# Altium footprint library ref-packages.PCBLIB: 1544 footprints (part 76 of 103)
Each footprint in its own frame and in the unit in brackets; x right, y up, seen from the top. Pads: shape width x height; smd on the part's side, far side on the other; paste and mask are expansions set on the pad; w line width, h text height; cw(c..) or ccw(c..) is an arc to the next point about the centre after c.
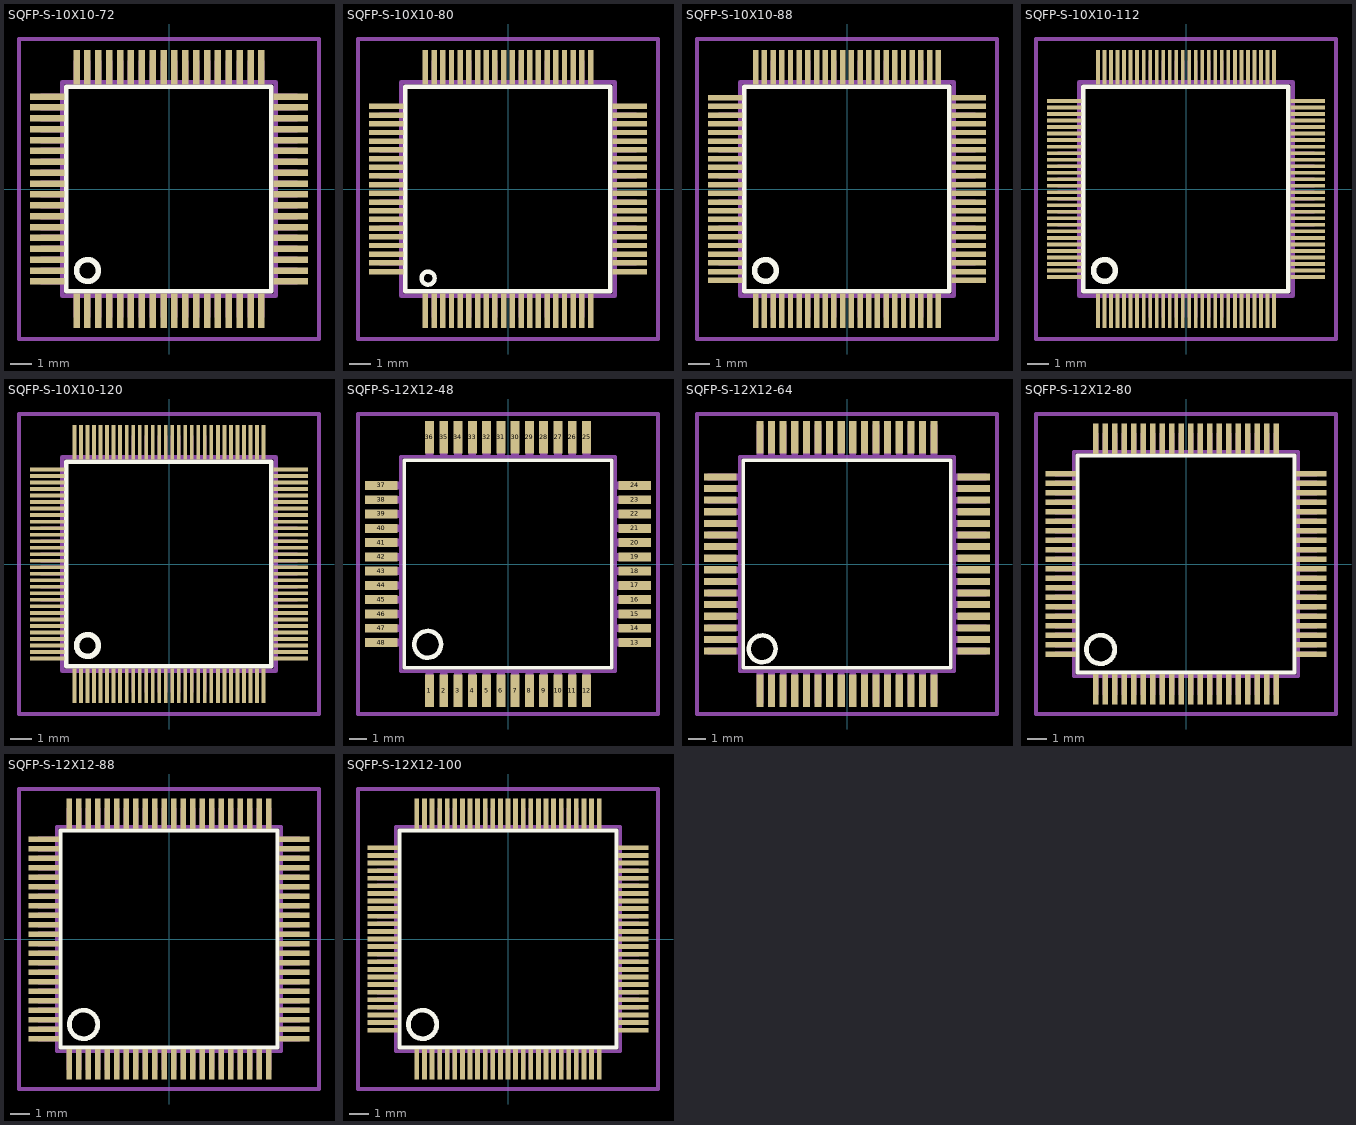
[diagram p75: the footprints below, top view; thin cyan lines are the x and y axes]

## SQFP-S-10X10-72 [mil]
pads (72):
  rect 11.81x62.99 smd: 1(-167.32,-220.47) 2(-147.64,-220.47) 3(-127.95,-220.47) 4(-108.27,-220.47) 5(-88.58,-220.47) 6(-68.9,-220.47) 7(-49.21,-220.47) 8(-29.53,-220.47) 9(-9.84,-220.47) 10(9.84,-220.47) 11(29.53,-220.47) 12(49.21,-220.47) 13(68.9,-220.47) 14(88.58,-220.47) 15(108.27,-220.47) 16(127.95,-220.47) 17(147.64,-220.47) 18(167.32,-220.47) 37(167.32,220.47) 38(147.64,220.47) 39(127.95,220.47) 40(108.27,220.47) 41(88.58,220.47) 42(68.9,220.47) 43(49.21,220.47) 44(29.53,220.47) 45(9.84,220.47) 46(-9.84,220.47) 47(-29.53,220.47) 48(-49.21,220.47) 49(-68.9,220.47) 50(-88.58,220.47) 51(-108.27,220.47) 52(-127.95,220.47) 53(-147.64,220.47) 54(-167.32,220.47)
  rect 62.99x11.81 smd: 19(220.47,-167.32) 20(220.47,-147.64) 21(220.47,-127.95) 22(220.47,-108.27) 23(220.47,-88.58) 24(220.47,-68.9) 25(220.47,-49.21) 26(220.47,-29.53) 27(220.47,-9.84) 28(220.47,9.84) 29(220.47,29.53) 30(220.47,49.21) 31(220.47,68.9) 32(220.47,88.58) 33(220.47,108.27) 34(220.47,127.95) 35(220.47,147.64) 36(220.47,167.32) 55(-220.47,167.32) 56(-220.47,147.64) 57(-220.47,127.95) 58(-220.47,108.27) 59(-220.47,88.58) 60(-220.47,68.9) 61(-220.47,49.21) 62(-220.47,29.53) 63(-220.47,9.84) 64(-220.47,-9.84) 65(-220.47,-29.53) 66(-220.47,-49.21) 67(-220.47,-68.9) 68(-220.47,-88.58) 69(-220.47,-108.27) 70(-220.47,-127.95) 71(-220.47,-147.64) 72(-220.47,-167.32)
Top Overlay:
  circle w10: c-147.64,-147.64 r19.69
  lines w8: -185.83,-185.43 185.43,-185.43 185.43,185.43 -185.83,185.43 -185.83,-185.43
Mechanical 16:
  rectangle: -173.23,-232.28 -161.42,-194.88
  rectangle: -153.54,-232.28 -141.73,-194.88
  rectangle: -133.86,-232.28 -122.05,-194.88
  rectangle: -114.17,-232.28 -102.36,-194.88
  rectangle: -94.49,-232.28 -82.68,-194.88
  rectangle: -74.8,-232.28 -62.99,-194.88
  rectangle: -55.12,-232.28 -43.31,-194.88
  rectangle: -35.43,-232.28 -23.62,-194.88
  rectangle: -15.75,-232.28 -3.94,-194.88
  rectangle: 3.94,-232.28 15.75,-194.88
  rectangle: 23.62,-232.28 35.43,-194.88
  rectangle: 43.31,-232.28 55.12,-194.88
  rectangle: 62.99,-232.28 74.8,-194.88
  rectangle: 82.68,-232.28 94.49,-194.88
  rectangle: 102.36,-232.28 114.17,-194.88
  rectangle: 122.05,-232.28 133.86,-194.88
  rectangle: 141.73,-232.28 153.54,-194.88
  rectangle: 161.42,-232.28 173.23,-194.88
  rectangle: 194.88,-173.23 232.28,-161.42
  rectangle: 194.88,-153.54 232.28,-141.73
  rectangle: 194.88,-133.86 232.28,-122.05
  rectangle: 194.88,-114.17 232.28,-102.36
  rectangle: 194.88,-94.49 232.28,-82.68
  rectangle: 194.88,-74.8 232.28,-62.99
  rectangle: 194.88,-55.12 232.28,-43.31
  rectangle: 194.88,-35.43 232.28,-23.62
  rectangle: 194.88,-15.75 232.28,-3.94
  rectangle: 194.88,3.94 232.28,15.75
  rectangle: 194.88,23.62 232.28,35.43
  rectangle: 194.88,43.31 232.28,55.12
  rectangle: 194.88,62.99 232.28,74.8
  rectangle: 194.88,82.68 232.28,94.49
  rectangle: 194.88,102.36 232.28,114.17
  rectangle: 194.88,122.05 232.28,133.86
  rectangle: 194.88,141.73 232.28,153.54
  rectangle: 194.88,161.42 232.28,173.23
  rectangle: 161.42,194.88 173.23,232.28
  rectangle: 141.73,194.88 153.54,232.28
  rectangle: 122.05,194.88 133.86,232.28
  rectangle: 102.36,194.88 114.17,232.28
  rectangle: 82.68,194.88 94.49,232.28
  rectangle: 62.99,194.88 74.8,232.28
  rectangle: 43.31,194.88 55.12,232.28
  rectangle: 23.62,194.88 35.43,232.28
  rectangle: 3.94,194.88 15.75,232.28
  rectangle: -15.75,194.88 -3.94,232.28
  rectangle: -35.43,194.88 -23.62,232.28
  rectangle: -55.12,194.88 -43.31,232.28
  rectangle: -74.8,194.88 -62.99,232.28
  rectangle: -94.49,194.88 -82.68,232.28
  rectangle: -114.17,194.88 -102.36,232.28
  rectangle: -133.86,194.88 -122.05,232.28
  rectangle: -153.54,194.88 -141.73,232.28
  rectangle: -173.23,194.88 -161.42,232.28
  rectangle: -232.28,161.42 -194.88,173.23
  rectangle: -232.28,141.73 -194.88,153.54
  rectangle: -232.28,122.05 -194.88,133.86
  rectangle: -232.28,102.36 -194.88,114.17
  rectangle: -232.28,82.68 -194.88,94.49
  rectangle: -232.28,62.99 -194.88,74.8
  rectangle: -232.28,43.31 -194.88,55.12
  rectangle: -232.28,23.62 -194.88,35.43
  rectangle: -232.28,3.94 -194.88,15.75
  rectangle: -232.28,-15.75 -194.88,-3.94
  rectangle: -232.28,-35.43 -194.88,-23.62
  rectangle: -232.28,-55.12 -194.88,-43.31
  rectangle: -232.28,-74.8 -194.88,-62.99
  rectangle: -232.28,-94.49 -194.88,-82.68
  rectangle: -232.28,-114.17 -194.88,-102.36
  rectangle: -232.28,-133.86 -194.88,-122.05
  rectangle: -232.28,-153.54 -194.88,-141.73
  rectangle: -232.28,-173.23 -194.88,-161.42
  lines w8: -193.31,-193.31 193.31,-193.31 193.31,193.31 -193.31,193.31 -193.31,-193.31
Mechanical 27:
  lines w7.87: -271.65,-271.65 -271.65,271.65 271.65,271.65 271.65,-271.65 -271.65,-271.65

## SQFP-S-10X10-80 [mm]
pads (80):
  rect 0.25x1.6 smd: 1(-3.8,-5.6) 2(-3.4,-5.6) 3(-3,-5.6) 4(-2.6,-5.6) 5(-2.2,-5.6) 6(-1.8,-5.6) 7(-1.4,-5.6) 8(-1,-5.6) 9(-0.6,-5.6) 10(-0.2,-5.6) 11(0.2,-5.6) 12(0.6,-5.6) 13(1,-5.6) 14(1.4,-5.6) 15(1.8,-5.6) 16(2.2,-5.6) 17(2.6,-5.6) 18(3,-5.6) 19(3.4,-5.6) 20(3.8,-5.6) 41(3.8,5.6) 42(3.4,5.6) 43(3,5.6) 44(2.6,5.6) 45(2.2,5.6) 46(1.8,5.6) 47(1.4,5.6) 48(1,5.6) 49(0.6,5.6) 50(0.2,5.6) 51(-0.2,5.6) 52(-0.6,5.6) 53(-1,5.6) 54(-1.4,5.6) 55(-1.8,5.6) 56(-2.2,5.6) 57(-2.6,5.6) 58(-3,5.6) 59(-3.4,5.6) 60(-3.8,5.6)
  rect 1.6x0.25 smd: 21(5.6,-3.8) 22(5.6,-3.4) 23(5.6,-3) 24(5.6,-2.6) 25(5.6,-2.2) 26(5.6,-1.8) 27(5.6,-1.4) 28(5.6,-1) 29(5.6,-0.6) 30(5.6,-0.2) 31(5.6,0.2) 32(5.6,0.6) 33(5.6,1) 34(5.6,1.4) 35(5.6,1.8) 36(5.6,2.2) 37(5.6,2.6) 38(5.6,3) 39(5.6,3.4) 40(5.6,3.8) 61(-5.6,3.8) 62(-5.6,3.4) 63(-5.6,3) 64(-5.6,2.6) 65(-5.6,2.2) 66(-5.6,1.8) 67(-5.6,1.4) 68(-5.6,1) 69(-5.6,0.6) 70(-5.6,0.2) 71(-5.6,-0.2) 72(-5.6,-0.6) 73(-5.6,-1) 74(-5.6,-1.4) 75(-5.6,-1.8) 76(-5.6,-2.2) 77(-5.6,-2.6) 78(-5.6,-3) 79(-5.6,-3.4) 80(-5.6,-3.8)
Top Overlay:
  circle w0.203: c-3.675,-4.1 r0.3
  lines w0.203: -4.72,-4.71 4.71,-4.71 4.71,4.71 -4.72,4.71 -4.72,-4.71
Mechanical 16:
  rectangle: -3.91,-5.9 -3.69,-4.95
  rectangle: -3.51,-5.9 -3.29,-4.95
  rectangle: -3.11,-5.9 -2.89,-4.95
  rectangle: -2.71,-5.9 -2.49,-4.95
  rectangle: -2.31,-5.9 -2.09,-4.95
  rectangle: -1.91,-5.9 -1.69,-4.95
  rectangle: -1.51,-5.9 -1.29,-4.95
  rectangle: -1.11,-5.9 -0.89,-4.95
  rectangle: -0.71,-5.9 -0.49,-4.95
  rectangle: -0.31,-5.9 -0.09,-4.95
  rectangle: 0.09,-5.9 0.31,-4.95
  rectangle: 0.49,-5.9 0.71,-4.95
  rectangle: 0.89,-5.9 1.11,-4.95
  rectangle: 1.29,-5.9 1.51,-4.95
  rectangle: 1.69,-5.9 1.91,-4.95
  rectangle: 2.09,-5.9 2.31,-4.95
  rectangle: 2.49,-5.9 2.71,-4.95
  rectangle: 2.89,-5.9 3.11,-4.95
  rectangle: 3.29,-5.9 3.51,-4.95
  rectangle: 3.69,-5.9 3.91,-4.95
  rectangle: 4.95,-3.91 5.9,-3.69
  rectangle: 4.95,-3.51 5.9,-3.29
  rectangle: 4.95,-3.11 5.9,-2.89
  rectangle: 4.95,-2.71 5.9,-2.49
  rectangle: 4.95,-2.31 5.9,-2.09
  rectangle: 4.95,-1.91 5.9,-1.69
  rectangle: 4.95,-1.51 5.9,-1.29
  rectangle: 4.95,-1.11 5.9,-0.89
  rectangle: 4.95,-0.71 5.9,-0.49
  rectangle: 4.95,-0.31 5.9,-0.09
  rectangle: 4.95,0.09 5.9,0.31
  rectangle: 4.95,0.49 5.9,0.71
  rectangle: 4.95,0.89 5.9,1.11
  rectangle: 4.95,1.29 5.9,1.51
  rectangle: 4.95,1.69 5.9,1.91
  rectangle: 4.95,2.09 5.9,2.31
  rectangle: 4.95,2.49 5.9,2.71
  rectangle: 4.95,2.89 5.9,3.11
  rectangle: 4.95,3.29 5.9,3.51
  rectangle: 4.95,3.69 5.9,3.91
  rectangle: 3.69,4.95 3.91,5.9
  rectangle: 3.29,4.95 3.51,5.9
  rectangle: 2.89,4.95 3.11,5.9
  rectangle: 2.49,4.95 2.71,5.9
  rectangle: 2.09,4.95 2.31,5.9
  rectangle: 1.69,4.95 1.91,5.9
  rectangle: 1.29,4.95 1.51,5.9
  rectangle: 0.89,4.95 1.11,5.9
  rectangle: 0.49,4.95 0.71,5.9
  rectangle: 0.09,4.95 0.31,5.9
  rectangle: -0.31,4.95 -0.09,5.9
  rectangle: -0.71,4.95 -0.49,5.9
  rectangle: -1.11,4.95 -0.89,5.9
  rectangle: -1.51,4.95 -1.29,5.9
  rectangle: -1.91,4.95 -1.69,5.9
  rectangle: -2.31,4.95 -2.09,5.9
  rectangle: -2.71,4.95 -2.49,5.9
  rectangle: -3.11,4.95 -2.89,5.9
  rectangle: -3.51,4.95 -3.29,5.9
  rectangle: -3.91,4.95 -3.69,5.9
  rectangle: -5.9,3.69 -4.95,3.91
  rectangle: -5.9,3.29 -4.95,3.51
  rectangle: -5.9,2.89 -4.95,3.11
  rectangle: -5.9,2.49 -4.95,2.71
  rectangle: -5.9,2.09 -4.95,2.31
  rectangle: -5.9,1.69 -4.95,1.91
  rectangle: -5.9,1.29 -4.95,1.51
  rectangle: -5.9,0.89 -4.95,1.11
  rectangle: -5.9,0.49 -4.95,0.71
  rectangle: -5.9,0.09 -4.95,0.31
  rectangle: -5.9,-0.31 -4.95,-0.09
  rectangle: -5.9,-0.71 -4.95,-0.49
  rectangle: -5.9,-1.11 -4.95,-0.89
  rectangle: -5.9,-1.51 -4.95,-1.29
  rectangle: -5.9,-1.91 -4.95,-1.69
  rectangle: -5.9,-2.31 -4.95,-2.09
  rectangle: -5.9,-2.71 -4.95,-2.49
  rectangle: -5.9,-3.11 -4.95,-2.89
  rectangle: -5.9,-3.51 -4.95,-3.29
  rectangle: -5.9,-3.91 -4.95,-3.69
  lines w0.203: -4.91,-4.91 4.91,-4.91 4.91,4.91 -4.91,4.91 -4.91,-4.91
Mechanical 27:
  lines w0.2: -6.9,-6.9 -6.9,6.9 6.9,6.9 6.9,-6.9 -6.9,-6.9

## SQFP-S-10X10-88 [mm]
pads (88):
  rect 0.25x1.6 smd: 1(-4.2,-5.6) 2(-3.8,-5.6) 3(-3.4,-5.6) 4(-3,-5.6) 5(-2.6,-5.6) 6(-2.2,-5.6) 7(-1.8,-5.6) 8(-1.4,-5.6) 9(-1,-5.6) 10(-0.6,-5.6) 11(-0.2,-5.6) 12(0.2,-5.6) 13(0.6,-5.6) 14(1,-5.6) 15(1.4,-5.6) 16(1.8,-5.6) 17(2.2,-5.6) 18(2.6,-5.6) 19(3,-5.6) 20(3.4,-5.6) 21(3.8,-5.6) 22(4.2,-5.6) 45(4.2,5.6) 46(3.8,5.6) 47(3.4,5.6) 48(3,5.6) 49(2.6,5.6) 50(2.2,5.6) 51(1.8,5.6) 52(1.4,5.6) 53(1,5.6) 54(0.6,5.6) 55(0.2,5.6) 56(-0.2,5.6) 57(-0.6,5.6) 58(-1,5.6) 59(-1.4,5.6) 60(-1.8,5.6) 61(-2.2,5.6) 62(-2.6,5.6) 63(-3,5.6) 64(-3.4,5.6) 65(-3.8,5.6) 66(-4.2,5.6)
  rect 1.6x0.25 smd: 23(5.6,-4.2) 24(5.6,-3.8) 25(5.6,-3.4) 26(5.6,-3) 27(5.6,-2.6) 28(5.6,-2.2) 29(5.6,-1.8) 30(5.6,-1.4) 31(5.6,-1) 32(5.6,-0.6) 33(5.6,-0.2) 34(5.6,0.2) 35(5.6,0.6) 36(5.6,1) 37(5.6,1.4) 38(5.6,1.8) 39(5.6,2.2) 40(5.6,2.6) 41(5.6,3) 42(5.6,3.4) 43(5.6,3.8) 44(5.6,4.2) 67(-5.6,4.2) 68(-5.6,3.8) 69(-5.6,3.4) 70(-5.6,3) 71(-5.6,2.6) 72(-5.6,2.2) 73(-5.6,1.8) 74(-5.6,1.4) 75(-5.6,1) 76(-5.6,0.6) 77(-5.6,0.2) 78(-5.6,-0.2) 79(-5.6,-0.6) 80(-5.6,-1) 81(-5.6,-1.4) 82(-5.6,-1.8) 83(-5.6,-2.2) 84(-5.6,-2.6) 85(-5.6,-3) 86(-5.6,-3.4) 87(-5.6,-3.8) 88(-5.6,-4.2)
Top Overlay:
  circle w0.254: c-3.75,-3.75 r0.5
  lines w0.203: -4.72,-4.71 4.71,-4.71 4.71,4.71 -4.72,4.71 -4.72,-4.71
Mechanical 16:
  rectangle: -4.31,-5.9 -4.09,-4.95
  rectangle: -3.91,-5.9 -3.69,-4.95
  rectangle: -3.51,-5.9 -3.29,-4.95
  rectangle: -3.11,-5.9 -2.89,-4.95
  rectangle: -2.71,-5.9 -2.49,-4.95
  rectangle: -2.31,-5.9 -2.09,-4.95
  rectangle: -1.91,-5.9 -1.69,-4.95
  rectangle: -1.51,-5.9 -1.29,-4.95
  rectangle: -1.11,-5.9 -0.89,-4.95
  rectangle: -0.71,-5.9 -0.49,-4.95
  rectangle: -0.31,-5.9 -0.09,-4.95
  rectangle: 0.09,-5.9 0.31,-4.95
  rectangle: 0.49,-5.9 0.71,-4.95
  rectangle: 0.89,-5.9 1.11,-4.95
  rectangle: 1.29,-5.9 1.51,-4.95
  rectangle: 1.69,-5.9 1.91,-4.95
  rectangle: 2.09,-5.9 2.31,-4.95
  rectangle: 2.49,-5.9 2.71,-4.95
  rectangle: 2.89,-5.9 3.11,-4.95
  rectangle: 3.29,-5.9 3.51,-4.95
  rectangle: 3.69,-5.9 3.91,-4.95
  rectangle: 4.09,-5.9 4.31,-4.95
  rectangle: 4.95,-4.31 5.9,-4.09
  rectangle: 4.95,-3.91 5.9,-3.69
  rectangle: 4.95,-3.51 5.9,-3.29
  rectangle: 4.95,-3.11 5.9,-2.89
  rectangle: 4.95,-2.71 5.9,-2.49
  rectangle: 4.95,-2.31 5.9,-2.09
  rectangle: 4.95,-1.91 5.9,-1.69
  rectangle: 4.95,-1.51 5.9,-1.29
  rectangle: 4.95,-1.11 5.9,-0.89
  rectangle: 4.95,-0.71 5.9,-0.49
  rectangle: 4.95,-0.31 5.9,-0.09
  rectangle: 4.95,0.09 5.9,0.31
  rectangle: 4.95,0.49 5.9,0.71
  rectangle: 4.95,0.89 5.9,1.11
  rectangle: 4.95,1.29 5.9,1.51
  rectangle: 4.95,1.69 5.9,1.91
  rectangle: 4.95,2.09 5.9,2.31
  rectangle: 4.95,2.49 5.9,2.71
  rectangle: 4.95,2.89 5.9,3.11
  rectangle: 4.95,3.29 5.9,3.51
  rectangle: 4.95,3.69 5.9,3.91
  rectangle: 4.95,4.09 5.9,4.31
  rectangle: 4.09,4.95 4.31,5.9
  rectangle: 3.69,4.95 3.91,5.9
  rectangle: 3.29,4.95 3.51,5.9
  rectangle: 2.89,4.95 3.11,5.9
  rectangle: 2.49,4.95 2.71,5.9
  rectangle: 2.09,4.95 2.31,5.9
  rectangle: 1.69,4.95 1.91,5.9
  rectangle: 1.29,4.95 1.51,5.9
  rectangle: 0.89,4.95 1.11,5.9
  rectangle: 0.49,4.95 0.71,5.9
  rectangle: 0.09,4.95 0.31,5.9
  rectangle: -0.31,4.95 -0.09,5.9
  rectangle: -0.71,4.95 -0.49,5.9
  rectangle: -1.11,4.95 -0.89,5.9
  rectangle: -1.51,4.95 -1.29,5.9
  rectangle: -1.91,4.95 -1.69,5.9
  rectangle: -2.31,4.95 -2.09,5.9
  rectangle: -2.71,4.95 -2.49,5.9
  rectangle: -3.11,4.95 -2.89,5.9
  rectangle: -3.51,4.95 -3.29,5.9
  rectangle: -3.91,4.95 -3.69,5.9
  rectangle: -4.31,4.95 -4.09,5.9
  rectangle: -5.9,4.09 -4.95,4.31
  rectangle: -5.9,3.69 -4.95,3.91
  rectangle: -5.9,3.29 -4.95,3.51
  rectangle: -5.9,2.89 -4.95,3.11
  rectangle: -5.9,2.49 -4.95,2.71
  rectangle: -5.9,2.09 -4.95,2.31
  rectangle: -5.9,1.69 -4.95,1.91
  rectangle: -5.9,1.29 -4.95,1.51
  rectangle: -5.9,0.89 -4.95,1.11
  rectangle: -5.9,0.49 -4.95,0.71
  rectangle: -5.9,0.09 -4.95,0.31
  rectangle: -5.9,-0.31 -4.95,-0.09
  rectangle: -5.9,-0.71 -4.95,-0.49
  rectangle: -5.9,-1.11 -4.95,-0.89
  rectangle: -5.9,-1.51 -4.95,-1.29
  rectangle: -5.9,-1.91 -4.95,-1.69
  rectangle: -5.9,-2.31 -4.95,-2.09
  rectangle: -5.9,-2.71 -4.95,-2.49
  rectangle: -5.9,-3.11 -4.95,-2.89
  rectangle: -5.9,-3.51 -4.95,-3.29
  rectangle: -5.9,-3.91 -4.95,-3.69
  rectangle: -5.9,-4.31 -4.95,-4.09
  lines w0.203: -4.91,-4.91 4.91,-4.91 4.91,4.91 -4.91,4.91 -4.91,-4.91
Mechanical 27:
  lines w0.2: -6.9,-6.9 -6.9,6.9 6.9,6.9 6.9,-6.9 -6.9,-6.9

## SQFP-S-10X10-112 [mm]
pads (112):
  rect 0.17x1.6 smd: 1(-4.05,-5.6) 2(-3.75,-5.6) 3(-3.45,-5.6) 4(-3.15,-5.6) 5(-2.85,-5.6) 6(-2.55,-5.6) 7(-2.25,-5.6) 8(-1.95,-5.6) 9(-1.65,-5.6) 10(-1.35,-5.6) 11(-1.05,-5.6) 12(-0.75,-5.6) 13(-0.45,-5.6) 14(-0.15,-5.6) 15(0.15,-5.6) 16(0.45,-5.6) 17(0.75,-5.6) 18(1.05,-5.6) 19(1.35,-5.6) 20(1.65,-5.6) 21(1.95,-5.6) 22(2.25,-5.6) 23(2.55,-5.6) 24(2.85,-5.6) 25(3.15,-5.6) 26(3.45,-5.6) 27(3.75,-5.6) 28(4.05,-5.6) 57(4.05,5.6) 58(3.75,5.6) 59(3.45,5.6) 60(3.15,5.6) 61(2.85,5.6) 62(2.55,5.6) 63(2.25,5.6) 64(1.95,5.6) 65(1.65,5.6) 66(1.35,5.6) 67(1.05,5.6) 68(0.75,5.6) 69(0.45,5.6) 70(0.15,5.6) 71(-0.15,5.6) 72(-0.45,5.6) 73(-0.75,5.6) 74(-1.05,5.6) 75(-1.35,5.6) 76(-1.65,5.6) 77(-1.95,5.6) 78(-2.25,5.6) 79(-2.55,5.6) 80(-2.85,5.6) 81(-3.15,5.6) 82(-3.45,5.6) 83(-3.75,5.6) 84(-4.05,5.6)
  rect 1.6x0.17 smd: 29(5.6,-4.05) 30(5.6,-3.75) 31(5.6,-3.45) 32(5.6,-3.15) 33(5.6,-2.85) 34(5.6,-2.55) 35(5.6,-2.25) 36(5.6,-1.95) 37(5.6,-1.65) 38(5.6,-1.35) 39(5.6,-1.05) 40(5.6,-0.75) 41(5.6,-0.45) 42(5.6,-0.15) 43(5.6,0.15) 44(5.6,0.45) 45(5.6,0.75) 46(5.6,1.05) 47(5.6,1.35) 48(5.6,1.65) 49(5.6,1.95) 50(5.6,2.25) 51(5.6,2.55) 52(5.6,2.85) 53(5.6,3.15) 54(5.6,3.45) 55(5.6,3.75) 56(5.6,4.05) 85(-5.6,4.05) 86(-5.6,3.75) 87(-5.6,3.45) 88(-5.6,3.15) 89(-5.6,2.85) 90(-5.6,2.55) 91(-5.6,2.25) 92(-5.6,1.95) 93(-5.6,1.65) 94(-5.6,1.35) 95(-5.6,1.05) 96(-5.6,0.75) 97(-5.6,0.45) 98(-5.6,0.15) 99(-5.6,-0.15) 100(-5.6,-0.45) 101(-5.6,-0.75) 102(-5.6,-1.05) 103(-5.6,-1.35) 104(-5.6,-1.65) 105(-5.6,-1.95) 106(-5.6,-2.25) 107(-5.6,-2.55) 108(-5.6,-2.85) 109(-5.6,-3.15) 110(-5.6,-3.45) 111(-5.6,-3.75) 112(-5.6,-4.05)
Top Overlay:
  circle w0.254: c-3.75,-3.75 r0.5
  lines w0.203: -4.72,-4.71 4.71,-4.71 4.71,4.71 -4.72,4.71 -4.72,-4.71
Mechanical 16:
  rectangle: -4.12,-5.9 -3.98,-4.95
  rectangle: -3.82,-5.9 -3.68,-4.95
  rectangle: -3.52,-5.9 -3.38,-4.95
  rectangle: -3.22,-5.9 -3.08,-4.95
  rectangle: -2.92,-5.9 -2.78,-4.95
  rectangle: -2.62,-5.9 -2.48,-4.95
  rectangle: -2.32,-5.9 -2.18,-4.95
  rectangle: -2.02,-5.9 -1.88,-4.95
  rectangle: -1.72,-5.9 -1.58,-4.95
  rectangle: -1.42,-5.9 -1.28,-4.95
  rectangle: -1.12,-5.9 -0.98,-4.95
  rectangle: -0.82,-5.9 -0.68,-4.95
  rectangle: -0.52,-5.9 -0.38,-4.95
  rectangle: -0.22,-5.9 -0.08,-4.95
  rectangle: 0.08,-5.9 0.22,-4.95
  rectangle: 0.38,-5.9 0.52,-4.95
  rectangle: 0.68,-5.9 0.82,-4.95
  rectangle: 0.98,-5.9 1.12,-4.95
  rectangle: 1.28,-5.9 1.42,-4.95
  rectangle: 1.58,-5.9 1.72,-4.95
  rectangle: 1.88,-5.9 2.02,-4.95
  rectangle: 2.18,-5.9 2.32,-4.95
  rectangle: 2.48,-5.9 2.62,-4.95
  rectangle: 2.78,-5.9 2.92,-4.95
  rectangle: 3.08,-5.9 3.22,-4.95
  rectangle: 3.38,-5.9 3.52,-4.95
  rectangle: 3.68,-5.9 3.82,-4.95
  rectangle: 3.98,-5.9 4.12,-4.95
  rectangle: 4.95,-4.12 5.9,-3.98
  rectangle: 4.95,-3.82 5.9,-3.68
  rectangle: 4.95,-3.52 5.9,-3.38
  rectangle: 4.95,-3.22 5.9,-3.08
  rectangle: 4.95,-2.92 5.9,-2.78
  rectangle: 4.95,-2.62 5.9,-2.48
  rectangle: 4.95,-2.32 5.9,-2.18
  rectangle: 4.95,-2.02 5.9,-1.88
  rectangle: 4.95,-1.72 5.9,-1.58
  rectangle: 4.95,-1.42 5.9,-1.28
  rectangle: 4.95,-1.12 5.9,-0.98
  rectangle: 4.95,-0.82 5.9,-0.68
  rectangle: 4.95,-0.52 5.9,-0.38
  rectangle: 4.95,-0.22 5.9,-0.08
  rectangle: 4.95,0.08 5.9,0.22
  rectangle: 4.95,0.38 5.9,0.52
  rectangle: 4.95,0.68 5.9,0.82
  rectangle: 4.95,0.98 5.9,1.12
  rectangle: 4.95,1.28 5.9,1.42
  rectangle: 4.95,1.58 5.9,1.72
  rectangle: 4.95,1.88 5.9,2.02
  rectangle: 4.95,2.18 5.9,2.32
  rectangle: 4.95,2.48 5.9,2.62
  rectangle: 4.95,2.78 5.9,2.92
  rectangle: 4.95,3.08 5.9,3.22
  rectangle: 4.95,3.38 5.9,3.52
  rectangle: 4.95,3.68 5.9,3.82
  rectangle: 4.95,3.98 5.9,4.12
  rectangle: 3.98,4.95 4.12,5.9
  rectangle: 3.68,4.95 3.82,5.9
  rectangle: 3.38,4.95 3.52,5.9
  rectangle: 3.08,4.95 3.22,5.9
  rectangle: 2.78,4.95 2.92,5.9
  rectangle: 2.48,4.95 2.62,5.9
  rectangle: 2.18,4.95 2.32,5.9
  rectangle: 1.88,4.95 2.02,5.9
  rectangle: 1.58,4.95 1.72,5.9
  rectangle: 1.28,4.95 1.42,5.9
  rectangle: 0.98,4.95 1.12,5.9
  rectangle: 0.68,4.95 0.82,5.9
  rectangle: 0.38,4.95 0.52,5.9
  rectangle: 0.08,4.95 0.22,5.9
  rectangle: -0.22,4.95 -0.08,5.9
  rectangle: -0.52,4.95 -0.38,5.9
  rectangle: -0.82,4.95 -0.68,5.9
  rectangle: -1.12,4.95 -0.98,5.9
  rectangle: -1.42,4.95 -1.28,5.9
  rectangle: -1.72,4.95 -1.58,5.9
  rectangle: -2.02,4.95 -1.88,5.9
  rectangle: -2.32,4.95 -2.18,5.9
  rectangle: -2.62,4.95 -2.48,5.9
  rectangle: -2.92,4.95 -2.78,5.9
  rectangle: -3.22,4.95 -3.08,5.9
  rectangle: -3.52,4.95 -3.38,5.9
  rectangle: -3.82,4.95 -3.68,5.9
  rectangle: -4.12,4.95 -3.98,5.9
  rectangle: -5.9,3.98 -4.95,4.12
  rectangle: -5.9,3.68 -4.95,3.82
  rectangle: -5.9,3.38 -4.95,3.52
  rectangle: -5.9,3.08 -4.95,3.22
  rectangle: -5.9,2.78 -4.95,2.92
  rectangle: -5.9,2.48 -4.95,2.62
  rectangle: -5.9,2.18 -4.95,2.32
  rectangle: -5.9,1.88 -4.95,2.02
  rectangle: -5.9,1.58 -4.95,1.72
  rectangle: -5.9,1.28 -4.95,1.42
  rectangle: -5.9,0.98 -4.95,1.12
  rectangle: -5.9,0.68 -4.95,0.82
  rectangle: -5.9,0.38 -4.95,0.52
  rectangle: -5.9,0.08 -4.95,0.22
  rectangle: -5.9,-0.22 -4.95,-0.08
  rectangle: -5.9,-0.52 -4.95,-0.38
  rectangle: -5.9,-0.82 -4.95,-0.68
  rectangle: -5.9,-1.12 -4.95,-0.98
  rectangle: -5.9,-1.42 -4.95,-1.28
  rectangle: -5.9,-1.72 -4.95,-1.58
  rectangle: -5.9,-2.02 -4.95,-1.88
  rectangle: -5.9,-2.32 -4.95,-2.18
  rectangle: -5.9,-2.62 -4.95,-2.48
  rectangle: -5.9,-2.92 -4.95,-2.78
  rectangle: -5.9,-3.22 -4.95,-3.08
  rectangle: -5.9,-3.52 -4.95,-3.38
  rectangle: -5.9,-3.82 -4.95,-3.68
  rectangle: -5.9,-4.12 -4.95,-3.98
  lines w0.203: -4.91,-4.91 4.91,-4.91 4.91,4.91 -4.91,4.91 -4.91,-4.91
Mechanical 27:
  lines w0.2: -6.9,-6.9 -6.9,6.9 6.9,6.9 6.9,-6.9 -6.9,-6.9

## SQFP-S-10X10-120 [mm]
pads (120):
  rect 0.17x1.6 smd: 1(-4.35,-5.6) 2(-4.05,-5.6) 3(-3.75,-5.6) 4(-3.45,-5.6) 5(-3.15,-5.6) 6(-2.85,-5.6) 7(-2.55,-5.6) 8(-2.25,-5.6) 9(-1.95,-5.6) 10(-1.65,-5.6) 11(-1.35,-5.6) 12(-1.05,-5.6) 13(-0.75,-5.6) 14(-0.45,-5.6) 15(-0.15,-5.6) 16(0.15,-5.6) 17(0.45,-5.6) 18(0.75,-5.6) 19(1.05,-5.6) 20(1.35,-5.6) 21(1.65,-5.6) 22(1.95,-5.6) 23(2.25,-5.6) 24(2.55,-5.6) 25(2.85,-5.6) 26(3.15,-5.6) 27(3.45,-5.6) 28(3.75,-5.6) 29(4.05,-5.6) 30(4.35,-5.6) 61(4.35,5.6) 62(4.05,5.6) 63(3.75,5.6) 64(3.45,5.6) 65(3.15,5.6) 66(2.85,5.6) 67(2.55,5.6) 68(2.25,5.6) 69(1.95,5.6) 70(1.65,5.6) 71(1.35,5.6) 72(1.05,5.6) 73(0.75,5.6) 74(0.45,5.6) 75(0.15,5.6) 76(-0.15,5.6) 77(-0.45,5.6) 78(-0.75,5.6) 79(-1.05,5.6) 80(-1.35,5.6) 81(-1.65,5.6) 82(-1.95,5.6) 83(-2.25,5.6) 84(-2.55,5.6) 85(-2.85,5.6) 86(-3.15,5.6) 87(-3.45,5.6) 88(-3.75,5.6) 89(-4.05,5.6) 90(-4.35,5.6)
  rect 1.6x0.17 smd: 31(5.6,-4.35) 32(5.6,-4.05) 33(5.6,-3.75) 34(5.6,-3.45) 35(5.6,-3.15) 36(5.6,-2.85) 37(5.6,-2.55) 38(5.6,-2.25) 39(5.6,-1.95) 40(5.6,-1.65) 41(5.6,-1.35) 42(5.6,-1.05) 43(5.6,-0.75) 44(5.6,-0.45) 45(5.6,-0.15) 46(5.6,0.15) 47(5.6,0.45) 48(5.6,0.75) 49(5.6,1.05) 50(5.6,1.35) 51(5.6,1.65) 52(5.6,1.95) 53(5.6,2.25) 54(5.6,2.55) 55(5.6,2.85) 56(5.6,3.15) 57(5.6,3.45) 58(5.6,3.75) 59(5.6,4.05) 60(5.6,4.35) 91(-5.6,4.35) 92(-5.6,4.05) 93(-5.6,3.75) 94(-5.6,3.45) 95(-5.6,3.15) 96(-5.6,2.85) 97(-5.6,2.55) 98(-5.6,2.25) 99(-5.6,1.95) 100(-5.6,1.65) 101(-5.6,1.35) 102(-5.6,1.05) 103(-5.6,0.75) 104(-5.6,0.45) 105(-5.6,0.15) 106(-5.6,-0.15) 107(-5.6,-0.45) 108(-5.6,-0.75) 109(-5.6,-1.05) 110(-5.6,-1.35) 111(-5.6,-1.65) 112(-5.6,-1.95) 113(-5.6,-2.25) 114(-5.6,-2.55) 115(-5.6,-2.85) 116(-5.6,-3.15) 117(-5.6,-3.45) 118(-5.6,-3.75) 119(-5.6,-4.05) 120(-5.6,-4.35)
Top Overlay:
  circle w0.254: c-3.75,-3.75 r0.5
  lines w0.203: -4.72,-4.71 4.71,-4.71 4.71,4.71 -4.72,4.71 -4.72,-4.71
Mechanical 16:
  rectangle: -4.42,-5.9 -4.28,-4.95
  rectangle: -4.12,-5.9 -3.98,-4.95
  rectangle: -3.82,-5.9 -3.68,-4.95
  rectangle: -3.52,-5.9 -3.38,-4.95
  rectangle: -3.22,-5.9 -3.08,-4.95
  rectangle: -2.92,-5.9 -2.78,-4.95
  rectangle: -2.62,-5.9 -2.48,-4.95
  rectangle: -2.32,-5.9 -2.18,-4.95
  rectangle: -2.02,-5.9 -1.88,-4.95
  rectangle: -1.72,-5.9 -1.58,-4.95
  rectangle: -1.42,-5.9 -1.28,-4.95
  rectangle: -1.12,-5.9 -0.98,-4.95
  rectangle: -0.82,-5.9 -0.68,-4.95
  rectangle: -0.52,-5.9 -0.38,-4.95
  rectangle: -0.22,-5.9 -0.08,-4.95
  rectangle: 0.08,-5.9 0.22,-4.95
  rectangle: 0.38,-5.9 0.52,-4.95
  rectangle: 0.68,-5.9 0.82,-4.95
  rectangle: 0.98,-5.9 1.12,-4.95
  rectangle: 1.28,-5.9 1.42,-4.95
  rectangle: 1.58,-5.9 1.72,-4.95
  rectangle: 1.88,-5.9 2.02,-4.95
  rectangle: 2.18,-5.9 2.32,-4.95
  rectangle: 2.48,-5.9 2.62,-4.95
  rectangle: 2.78,-5.9 2.92,-4.95
  rectangle: 3.08,-5.9 3.22,-4.95
  rectangle: 3.38,-5.9 3.52,-4.95
  rectangle: 3.68,-5.9 3.82,-4.95
  rectangle: 3.98,-5.9 4.12,-4.95
  rectangle: 4.28,-5.9 4.42,-4.95
  rectangle: 4.95,-4.42 5.9,-4.28
  rectangle: 4.95,-4.12 5.9,-3.98
  rectangle: 4.95,-3.82 5.9,-3.68
  rectangle: 4.95,-3.52 5.9,-3.38
  rectangle: 4.95,-3.22 5.9,-3.08
  rectangle: 4.95,-2.92 5.9,-2.78
  rectangle: 4.95,-2.62 5.9,-2.48
  rectangle: 4.95,-2.32 5.9,-2.18
  rectangle: 4.95,-2.02 5.9,-1.88
  rectangle: 4.95,-1.72 5.9,-1.58